# Altium footprint library CONN_B2B.PcbLib: 27 footprints (part 2 of 3) (continued)
## QRF8_018_D_DP_A [mm] "Samtec, QRF8-018-D-DP-A, 0.80 mm Q Rate® High-Speed Ground Plane Slim Body Socket Strip, Differential Pair"
pads (42):
  oval 0.5x1.6 smd mask+0.05: 1(-10,-1.5) 2(-10,1.5) 3(-9.2,-1.5) 4(-9.2,1.5) 5(-7.6,-1.5) 6(-7.6,1.5) 7(-6.8,-1.5) 8(-6.8,1.5) 9(-5.2,-1.5) 10(-5.2,1.5) 11(-4.4,-1.5) 12(-4.4,1.5) 13(-2.8,-1.5) 14(-2.8,1.5) 15(-2,-1.5) 16(-2,1.5) 17(-0.4,-1.5) 18(-0.4,1.5) 19(0.4,-1.5) 20(0.4,1.5) 21(2,-1.5) 22(2,1.5) 23(2.8,-1.5) 24(2.8,1.5) 25(4.4,-1.5) 26(4.4,1.5) 27(5.2,-1.5) 28(5.2,1.5) 29(6.8,-1.5) 30(6.8,1.5) 31(7.6,-1.5) 32(7.6,1.5) 33(9.2,-1.5) 34(9.2,1.5) 35(10,-1.5) 36(10,1.5)
  oval 4.6x0.6 smd mask+0.05: G1(-8.4,0) G2(-2.8,0) G3(2.8,0) G4(8.4,0)
  round 1.2 hole 1.2 unplated mask+0.1: ""(-11.4,-1.2) ""(11.4,-1.2)
Top Overlay:
  lines w0.2: -14.3,-0.8 -14.3,2.4 14.3,2.4 14.3,0.9 14.1,0.9 14.1,-0.9 14.3,-0.9 14.3,-2.4 -12.7,-2.4 -14.3,-0.8
Mechanical 13:
  lines w0.1: -14.185,-0.8 -14.185,2.3 14.185,2.3 14.185,1 14.085,1 14.085,-1 14.185,-1 14.185,-2.3 -12.685,-2.3 -14.185,-0.8
3D body "QRF8-018-05.0-L-D-DP-A.stp": height 6.26, standoff -1.28, extent -14.185,-2.3 14.185,2.3

## QRF8_026_L_D_A [mm] "CONN, B2B, SAMTEC, QRF8, QRF8-026-05.0-L-D-A, 0.80 mm Q Rate® Slim Body Ground Plane Socket"
pads (58):
  oval 0.5x1.8 smd mask+0.05: 1(-10,-1.6) 2(-10,1.6) 3(-9.2,-1.6) 4(-9.2,1.6) 5(-8.4,-1.6) 6(-8.4,1.6) 7(-7.6,-1.6) 8(-7.6,1.6) 9(-6.8,-1.6) 10(-6.8,1.6) 11(-6,-1.6) 12(-6,1.6) 13(-5.2,-1.6) 14(-5.2,1.6) 15(-4.4,-1.6) 16(-4.4,1.6) 17(-3.6,-1.6) 18(-3.6,1.6) 19(-2.8,-1.6) 20(-2.8,1.6) 21(-2,-1.6) 22(-2,1.6) 23(-1.2,-1.6) 24(-1.2,1.6) 25(-0.4,-1.6) 26(-0.4,1.6) 27(0.4,-1.6) 28(0.4,1.6) 29(1.2,-1.6) 30(1.2,1.6) 31(2,-1.6) 32(2,1.6) 33(2.8,-1.6) 34(2.8,1.6) 35(3.6,-1.6) 36(3.6,1.6) 37(4.4,-1.6) 38(4.4,1.6) 39(5.2,-1.6) 40(5.2,1.6) 41(6,-1.6) 42(6,1.6) 43(6.8,-1.6) 44(6.8,1.6) 45(7.6,-1.6) 46(7.6,1.6) 47(8.4,-1.6) 48(8.4,1.6) 49(9.2,-1.6) 50(9.2,1.6) 51(10,-1.6) 52(10,1.6)
  rect 4.8x0.6 smd mask+0.05: G1(-8.4,0) G2(-2.8,0) G3(2.8,0) G4(8.4,0)
  round 0 hole 1.2 unplated: ""(-11.4,-1.2) ""(11.4,-1.2)
Top Overlay:
  lines w0.2: -10.4,-2.4 -12.7,-2.4 -14.3,-0.8 -14.3,2.4 -10.4,2.4 ; 10.4,-2.4 14.3,-2.4 14.3,2.4 10.4,2.4
Mechanical 1:
  lines w0.1: -14.185,-0.8 -12.685,-2.3 14.185,-2.3 14.185,2.3 -14.185,2.3 -14.185,-0.8
3D body "QRF8-026-05.0-L-D-A.stp": height 6.26, standoff -1.28, extent -14.185,-2.3 14.185,2.3

## QRF8_036_D_DP_A [mm] "Samtec, QRF8-036-D-DP-A, 0.80 mm Q Rate® High-Speed Ground Plane Slim Body Socket Strip, Differential Pair"
pads (82):
  oval 0.5x1.6 smd mask+0.05: 1(-22.4,-1.5) 2(-22.4,1.5) 3(-21.6,-1.5) 4(-21.6,1.5) 5(-20,-1.5) 6(-20,1.5) 7(-19.2,-1.5) 8(-19.2,1.5) 9(-17.6,-1.5) 10(-17.6,1.5) 11(-16.8,-1.5) 12(-16.8,1.5) 13(-15.2,-1.5) 14(-15.2,1.5) 15(-14.4,-1.5) 16(-14.4,1.5) 17(-12.8,-1.5) 18(-12.8,1.5) 19(-12,-1.5) 20(-12,1.5) 21(-10.4,-1.5) 22(-10.4,1.5) 23(-9.6,-1.5) 24(-9.6,1.5) 25(-8,-1.5) 26(-8,1.5) 27(-7.2,-1.5) 28(-7.2,1.5) 29(-5.6,-1.5) 30(-5.6,1.5) 31(-4.8,-1.5) 32(-4.8,1.5) 33(-3.2,-1.5) 34(-3.2,1.5) 35(-2.4,-1.5) 36(-2.4,1.5) 37(2.4,-1.5) 38(2.4,1.5) 39(3.2,-1.5) 40(3.2,1.5) 41(4.8,-1.5) 42(4.8,1.5) 43(5.6,-1.5) 44(5.6,1.5) 45(7.2,-1.5) 46(7.2,1.5) 47(8,-1.5) 48(8,1.5) 49(9.6,-1.5) 50(9.6,1.5) 51(10.4,-1.5) 52(10.4,1.5) 53(12,-1.5) 54(12,1.5) 55(12.8,-1.5) 56(12.8,1.5) 57(14.4,-1.5) 58(14.4,1.5) 59(15.2,-1.5) 60(15.2,1.5) 61(16.8,-1.5) 62(16.8,1.5) 63(17.6,-1.5) 64(17.6,1.5) 65(19.2,-1.5) 66(19.2,1.5) 67(20,-1.5) 68(20,1.5) 69(21.6,-1.5) 70(21.6,1.5) 71(22.4,-1.5) 72(22.4,1.5)
  oval 4.6x0.6 smd mask+0.05: G1(-20.8,0) G2(-15.2,0) G3(-9.6,0) G4(-4,0) G5(4,0) G6(9.6,0) G7(15.2,0) G8(20.8,0)
  round 1.2 hole 1.2 unplated mask+0.1: ""(-23.8,-1.2) ""(23.8,-1.2)
Top Overlay:
  lines w0.2: -26.7,-0.8 -25.1,-2.4 26.7,-2.4 26.7,-0.9 26.5,-0.9 26.5,0.9 26.7,0.9 26.7,2.4 -26.7,2.4 -26.7,-0.8
Mechanical 13:
  lines w0.1: -26.585,-0.8 -25.085,-2.3 26.585,-2.3 26.585,-1 26.485,-1 26.485,1 26.585,1 26.585,2.3 -26.585,2.3 -26.585,-0.8
3D body "QRF8-036-05.0-L-D-DP-A.stp": height 6.26, standoff -1.28, extent -26.585,-2.3 26.585,2.3

## QSE_060_01 [mm] "samtec 0.80 mm Q Strip® High Speed Ground Plane Socket Strip"
pads (134):
  oval 0.4x2.4 smd: 1(-27.6,-3) 2(-27.6,3) 3(-26.8,-3) 4(-26.8,3) 5(-26,-3) 6(-26,3) 7(-25.2,-3) 8(-25.2,3) 9(-24.4,-3) 10(-24.4,3) 11(-23.6,-3) 12(-23.6,3) 13(-22.8,-3) 14(-22.8,3) 15(-22,-3) 16(-22,3) 17(-21.2,-3) 18(-21.2,3) 19(-20.4,-3) 20(-20.4,3) 21(-19.6,-3) 22(-19.6,3) 23(-18.8,-3) 24(-18.8,3) 25(-18,-3) 26(-18,3) 27(-17.2,-3) 28(-17.2,3) 29(-16.4,-3) 30(-16.4,3) 31(-15.6,-3) 32(-15.6,3) 33(-14.8,-3) 34(-14.8,3) 35(-14,-3) 36(-14,3) 37(-13.2,-3) 38(-13.2,3) 39(-12.4,-3) 40(-12.4,3) 41(-7.6,-3) 42(-7.6,3) 43(-6.8,-3) 44(-6.8,3) 45(-6,-3) 46(-6,3) 47(-5.2,-3) 48(-5.2,3) 49(-4.4,-3) 50(-4.4,3) 51(-3.6,-3) 52(-3.6,3) 53(-2.8,-3) 54(-2.8,3) 55(-2,-3) 56(-2,3) 57(-1.2,-3) 58(-1.2,3) 59(-0.4,-3) 60(-0.4,3) 61(0.4,-3) 62(0.4,3) 63(1.2,-3) 64(1.2,3) 65(2,-3) 66(2,3) 67(2.8,-3) 68(2.8,3) 69(3.6,-3) 70(3.6,3) 71(4.4,-3) 72(4.4,3) 73(5.2,-3) 74(5.2,3) 75(6,-3) 76(6,3) 77(6.8,-3) 78(6.8,3) 79(7.6,-3) 80(7.6,3) 81(12.4,-3) 82(12.4,3) 83(13.2,-3) 84(13.2,3) 85(14,-3) 86(14,3) 87(14.8,-3) 88(14.8,3) 89(15.6,-3) 90(15.6,3) 91(16.4,-3) 92(16.4,3) 93(17.2,-3) 94(17.2,3) 95(18,-3) 96(18,3) 97(18.8,-3) 98(18.8,3) 99(19.6,-3) 100(19.6,3) 101(20.4,-3) 102(20.4,3) 103(21.2,-3) 104(21.2,3) 105(22,-3) 106(22,3) 107(22.8,-3) 108(22.8,3) 109(23.6,-3) 110(23.6,3) 111(24.4,-3) 112(24.4,3) 113(25.2,-3) 114(25.2,3) 115(26,-3) 116(26,3) 117(26.8,-3) 118(26.8,3) 119(27.6,-3) 120(27.6,3)
  oval 3x1 smd mask+0.1: 121(-28.1,0) 124(-12,0) 125(-8.2,0) 128(8.2,0) 129(12,0) 132(28.1,0)
  oval 5x1 smd mask+0.1: 122(-23.2,0) 123(-16.9,0) 126(-3.3,0) 127(3.3,0) 130(16.9,0) 131(23.2,0)
  round 1 hole 1 unplated: ""(-30,2.7) ""(30.1,2.7)
Top Overlay:
  circle w0.2: c-28.3,-4.1 r0.2
  lines w0.2: -30.7,1.3 -28.3,3.7 ; -28,-3.7 -30.7,-3.7 -30.7,3.7 -28,3.7 ; -11.95,-3.7 -8.05,-3.7 ; -11.95,3.7 -8.05,3.7 ; 8.05,-3.7 11.95,-3.7 ; 8.05,3.7 11.95,3.7 ; 27.95,-3.7 30.7,-3.7 30.7,3.7 28,3.7 ; 28.3,3.7 30.7,1.3
Mechanical 13:
  lines w0.1: -30.6,-3.6 -30.6,3.6 30.6,3.6 30.6,-3.6 -30.6,-3.6
3D body "Samtec-QSE-060-01-L-D-A.step": height 3.25, standoff -0.75, extent -30.6,-3.7 30.677,3.793

## QSH_030_01 [mm] "samtec 0.50mm Q Strip® High Speed Ground Plane Socket Strip"
height 1.2
pads (66):
  oval 0.3x2.4 smd paste-0.05 mask+0.05: 1(-7.25,-3) 2(-7.25,3) 3(-6.75,-3) 4(-6.75,3) 5(-6.25,-3) 6(-6.25,3) 7(-5.75,-3) 8(-5.75,3) 9(-5.25,-3) 10(-5.25,3) 11(-4.75,-3) 12(-4.75,3) 13(-4.25,-3) 14(-4.25,3) 15(-3.75,-3) 16(-3.75,3) 17(-3.25,-3) 18(-3.25,3) 19(-2.75,-3) 20(-2.75,3) 21(-2.25,-3) 22(-2.25,3) 23(-1.75,-3) 24(-1.75,3) 25(-1.25,-3) 26(-1.25,3) 27(-0.75,-3) 28(-0.75,3) 29(-0.25,-3) 30(-0.25,3) 31(0.25,-3) 32(0.25,3) 33(0.75,-3) 34(0.75,3) 35(1.25,-3) 36(1.25,3) 37(1.75,-3) 38(1.75,3) 39(2.25,-3) 40(2.25,3) 41(2.75,-3) 42(2.75,3) 43(3.25,-3) 44(3.25,3) 45(3.75,-3) 46(3.75,3) 47(4.25,-3) 48(4.25,3) 49(4.75,-3) 50(4.75,3) 51(5.25,-3) 52(5.25,3) 53(5.75,-3) 54(5.75,3) 55(6.25,-3) 56(6.25,3) 57(6.75,-3) 58(6.75,3) 59(7.25,-3) 60(7.25,3)
  rect 2.5x0.5 smd mask+0.1: 61(-8.065,0) 64(8.065,0)
  rect 5x0.5 smd mask+0.1: 62(-3.175,0) 63(3.175,0)
  round 1 hole 1 unplated: ""(-10,2.7) ""(10,2.7)
Top Overlay:
  circle w0.2: c-8.15,-4.05 r0.2
  lines w0.2: -10.8,0 -10.8,0.63 -7.747,3.683 -10.5,3.683 ; -10.8,3.6 -10.8,-3.683 -7.747,-3.683 ; 7.747,-3.683 10.8,-3.683 10.8,3.6 ; 10.541,3.683 7.747,3.683 10.8,0.63 10.8,0
  text "1" at -7.7,-4.5 h0.6
  text "2" at -8,4 h0.6
Mechanical 15:
  lines w0.254: -10.655,-3.62 -10.655,3.62 10.655,3.62 10.655,-3.62 -10.655,-3.62
3D body "QSH-030-01-L-D-A.stp": height 3.25, standoff -0.31, extent -10.65,-3.75 10.661,3.744

## QSH_060_01 [mm] "samtec 0.50mm Q Strip® High Speed Ground Plane Socket Strip, QSH-060-01-L-D-A"
pads (130):
  oval 0.25x2.5 smd mask+0.05: 1(-17.25,-3) 3(-16.75,-3) 5(-16.25,-3) 7(-15.75,-3) 9(-15.25,-3) 11(-14.75,-3) 13(-14.25,-3) 15(-13.75,-3) 17(-13.25,-3) 19(-12.75,-3) 21(-12.25,-3) 23(-11.75,-3) 25(-11.25,-3) 27(-10.75,-3) 29(-10.25,-3) 31(-9.75,-3) 33(-9.25,-3) 35(-8.75,-3) 37(-8.25,-3) 39(-7.75,-3) 41(-7.25,-3) 43(-6.75,-3) 45(-6.25,-3) 47(-5.75,-3) 49(-5.25,-3) 51(-4.75,-3) 53(-4.25,-3) 55(-3.75,-3) 57(-3.25,-3) 59(-2.75,-3) 61(2.75,-3) 63(3.25,-3) 65(3.75,-3) 67(4.25,-3) 69(4.75,-3) 71(5.25,-3) 73(5.75,-3) 75(6.25,-3) 77(6.75,-3) 79(7.25,-3) 81(7.75,-3) 83(8.25,-3) 85(8.75,-3) 87(9.25,-3) 89(9.75,-3) 91(10.25,-3) 93(10.75,-3) 95(11.25,-3) 97(11.75,-3) 99(12.25,-3) 101(12.75,-3) 103(13.25,-3) 105(13.75,-3) 107(14.25,-3) 109(14.75,-3) 111(15.25,-3) 113(15.75,-3) 115(16.25,-3) 117(16.75,-3) 119(17.25,-3)
  oval 0.25x2.4 smd mask+0.05: 2(-17.25,3) 4(-16.75,3) 6(-16.25,3) 8(-15.75,3) 10(-15.25,3) 12(-14.75,3) 14(-14.25,3) 16(-13.75,3) 18(-13.25,3) 20(-12.75,3) 22(-12.25,3) 24(-11.75,3) 26(-11.25,3) 28(-10.75,3) 30(-10.25,3) 32(-9.75,3) 34(-9.25,3) 36(-8.75,3) 38(-8.25,3) 40(-7.75,3) 42(-7.25,3) 44(-6.75,3) 46(-6.25,3) 48(-5.75,3) 50(-5.25,3) 52(-4.75,3) 54(-4.25,3) 56(-3.75,3) 58(-3.25,3) 60(-2.75,3) 62(2.75,3) 64(3.25,3) 66(3.75,3) 68(4.25,3) 70(4.75,3) 72(5.25,3) 74(5.75,3) 76(6.25,3) 78(6.75,3) 80(7.25,3) 82(7.75,3) 84(8.25,3) 86(8.75,3) 88(9.25,3) 90(9.75,3) 92(10.25,3) 94(10.75,3) 96(11.25,3) 98(11.75,3) 100(12.25,3) 102(12.75,3) 104(13.25,3) 106(13.75,3) 108(14.25,3) 110(14.75,3) 112(15.25,3) 114(15.75,3) 116(16.25,3) 118(16.75,3) 120(17.25,3)
  oval 2.5x0.5 smd mask+0.1: 121(-18.065,0) 124(-1.935,0) 125(1.935,0) 128(18.065,0)
  oval 5x0.5 smd mask+0.1: 122(-13.175,0) 123(-6.825,0) 126(6.825,0) 127(13.175,0)
  round 1 hole 1 unplated: ""(-20,2.7) ""(20,2.7)
Top Overlay:
  circle w0.2: c-18.3,-4.3 r0.2
  lines w0.2: -17.5,-3.9 -20.8,-3.9 -20.8,3.9 -17.5,3.9 ; -2.4,-3.9 2.4,-3.9 ; -2.4,3.9 2.4,3.9 ; 17.5,-3.9 20.8,-3.9 20.8,3.9 17.5,3.9
  text "1" at -17.8,-4.9 h0.6
  text "2" at -18,4.2 h0.6
  text "60" at -2.3,4.2 h0.6
  text "59" at -2.3,-4.8 h0.6
  text "62" at 1.4,4.2 h0.6
  text "61" at 1.7,-4.8 h0.6
  text "119" at 17.6,-4.8 h0.6
  text "120" at 17.5,4.3 h0.6
Mechanical 15:
  lines w0.254: -20.65,-3.62 -20.65,3.62 20.65,3.62 20.65,-3.62 -20.65,-3.62
3D body "Samtec-QSH-060-01-L-D-A.step": height 3.2, standoff -0.8, extent -20.677,-3.746 20.636,3.747

## QTE_060_03 [mm] "samtec 0.80 mm Q Strip® High Speed Ground Plane Terminal Strip"
pads (134):
  oval 0.4x2.4 smd: 1(-27.6,3) 2(-27.6,-3) 3(-26.8,3) 4(-26.8,-3) 5(-26,3) 6(-26,-3) 7(-25.2,3) 8(-25.2,-3) 9(-24.4,3) 10(-24.4,-3) 11(-23.6,3) 12(-23.6,-3) 13(-22.8,3) 14(-22.8,-3) 15(-22,3) 16(-22,-3) 17(-21.2,3) 18(-21.2,-3) 19(-20.4,3) 20(-20.4,-3) 21(-19.6,3) 22(-19.6,-3) 23(-18.8,3) 24(-18.8,-3) 25(-18,3) 26(-18,-3) 27(-17.2,3) 28(-17.2,-3) 29(-16.4,3) 30(-16.4,-3) 31(-15.6,3) 32(-15.6,-3) 33(-14.8,3) 34(-14.8,-3) 35(-14,3) 36(-14,-3) 37(-13.2,3) 38(-13.2,-3) 39(-12.4,3) 40(-12.4,-3) 41(-7.6,3) 42(-7.6,-3) 43(-6.8,3) 44(-6.8,-3) 45(-6,3) 46(-6,-3) 47(-5.2,3) 48(-5.2,-3) 49(-4.4,3) 50(-4.4,-3) 51(-3.6,3) 52(-3.6,-3) 53(-2.8,3) 54(-2.8,-3) 55(-2,3) 56(-2,-3) 57(-1.2,3) 58(-1.2,-3) 59(-0.4,3) 60(-0.4,-3) 61(0.4,3) 62(0.4,-3) 63(1.2,3) 64(1.2,-3) 65(2,3) 66(2,-3) 67(2.8,3) 68(2.8,-3) 69(3.6,3) 70(3.6,-3) 71(4.4,3) 72(4.4,-3) 73(5.2,3) 74(5.2,-3) 75(6,3) 76(6,-3) 77(6.8,3) 78(6.8,-3) 79(7.6,3) 80(7.6,-3) 81(12.4,3) 82(12.4,-3) 83(13.2,3) 84(13.2,-3) 85(14,3) 86(14,-3) 87(14.8,3) 88(14.8,-3) 89(15.6,3) 90(15.6,-3) 91(16.4,3) 92(16.4,-3) 93(17.2,3) 94(17.2,-3) 95(18,3) 96(18,-3) 97(18.8,3) 98(18.8,-3) 99(19.6,3) 100(19.6,-3) 101(20.4,3) 102(20.4,-3) 103(21.2,3) 104(21.2,-3) 105(22,3) 106(22,-3) 107(22.8,3) 108(22.8,-3) 109(23.6,3) 110(23.6,-3) 111(24.4,3) 112(24.4,-3) 113(25.2,3) 114(25.2,-3) 115(26,3) 116(26,-3) 117(26.8,3) 118(26.8,-3) 119(27.6,3) 120(27.6,-3)
  oval 3x1 smd mask+0.1: 121(-28.1,0) 124(-12,0) 125(-8.2,0) 128(8.2,0) 129(12,0) 132(28.1,0)
  oval 5x1 smd mask+0.1: 122(-23.2,0) 123(-16.9,0) 126(-3.3,0) 127(3.3,0) 130(16.9,0) 131(23.2,0)
  round 1 hole 1 unplated: ""(-29.2,2.1) ""(29.2,2.1)
Top Overlay:
  circle w0.2: c-28.3,3.7 r0.2
  lines w0.2: -28,-3.1 -28.4,-3.1 -30.1,-1.4 -30.1,3.1 -28,3.1 ; -11.95,-3.1 -8.05,-3.1 ; -11.95,3.1 -8.05,3.1 ; 8.05,-3.1 11.95,-3.1 ; 8.05,3.1 11.95,3.1 ; 28,-3.1 28.4,-3.1 30.1,-1.4 30.1,3.1 28,3.1
Mechanical 13:
  lines w0.1: -30,-1.1 -28.1,-3 28.1,-3 30,-1.1 30,3 -30,3 -30,-1.1
3D body "Samtec-QTE-060-03-L-D-A.step": height 10.26, standoff -0.71, extent -30,-3.456 30.008,3.656

## QTH_030_01 [mm] "samtec 0.50 mm Q Strip® High Speed Ground Plane Terminal Strip"
pads (66):
  oval 0.25x1.6 smd mask+0.05: 1(-7.25,3.2) 2(-7.25,-3.2) 3(-6.75,3.2) 4(-6.75,-3.2) 5(-6.25,3.2) 6(-6.25,-3.2) 7(-5.75,3.2) 8(-5.75,-3.2) 9(-5.25,3.2) 10(-5.25,-3.2) 11(-4.75,3.2) 12(-4.75,-3.2) 13(-4.25,3.2) 14(-4.25,-3.2) 15(-3.75,3.2) 16(-3.75,-3.2) 17(-3.25,3.2) 18(-3.25,-3.2) 19(-2.75,3.2) 20(-2.75,-3.2) 21(-2.25,3.2) 22(-2.25,-3.2) 23(-1.75,3.2) 24(-1.75,-3.2) 25(-1.25,3.2) 26(-1.25,-3.2) 27(-0.75,3.2) 28(-0.75,-3.2) 29(-0.25,3.2) 30(-0.25,-3.2) 31(0.25,3.2) 32(0.25,-3.2) 33(0.75,3.2) 34(0.75,-3.2) 35(1.25,3.2) 36(1.25,-3.2) 37(1.75,3.2) 38(1.75,-3.2) 39(2.25,3.2) 40(2.25,-3.2) 41(2.75,3.2) 42(2.75,-3.2) 43(3.25,3.2) 44(3.25,-3.2) 45(3.75,3.2) 46(3.75,-3.2) 47(4.25,3.2) 48(4.25,-3.2) 49(4.75,3.2) 50(4.75,-3.2) 51(5.25,3.2) 52(5.25,-3.2) 53(5.75,3.2) 54(5.75,-3.2) 55(6.25,3.2) 56(6.25,-3.2) 57(6.75,3.2) 58(6.75,-3.2) 59(7.25,3.2) 60(7.25,-3.2)
  oval 2.5x0.7 smd mask+0.1: 61(-8.445,0) 64(8.445,0)
  oval 5x0.7 smd mask+0.1: 62(-3.175,0) 63(3.175,0)
  round 1 hole 1 unplated: ""(-9.25,2) ""(9.25,2)
Top Overlay:
  circle w0.2: c-8.3,3.7 r0.2
  lines w0.2: -7.6,-3.2 -8.4,-3.2 -10.2,-1.4 -10.2,3.2 -7.6,3.2 ; 7.5,-3.2 8.3,-3.2 10.2,-1.3 10.2,3.2 7.6,3.2
  text "2" at -8,-4.1 h0.6
  text "1" at -7.9,3.5 h0.6
Mechanical 15:
  lines w0.254: -10,-1.285 -10,2.985 10,2.985 10,-1.185 8.2,-2.985 -8.3,-2.985 -10,-1.285
3D body "Samtec-QTH-030-01-L-D-A.step": height 4.31, standoff -0.69, extent -10.001,-3.556 10.001,3.556

## QTH_030_04 [mm] "samtec 0.50 mm Q Strip® High Speed Ground Plane Terminal Strip"
height 1.2
pads (66):
  oval 0.3x1.6 smd paste-0.065 mask+0.05: 1(-7.25,3.1) 2(-7.25,-3.1) 3(-6.75,3.1) 4(-6.75,-3.1) 5(-6.25,3.1) 6(-6.25,-3.1) 7(-5.75,3.1) 8(-5.75,-3.1) 9(-5.25,3.1) 10(-5.25,-3.1) 11(-4.75,3.1) 12(-4.75,-3.1) 13(-4.25,3.1) 14(-4.25,-3.1) 15(-3.75,3.1) 16(-3.75,-3.1) 17(-3.25,3.1) 18(-3.25,-3.1) 19(-2.75,3.1) 20(-2.75,-3.1) 21(-2.25,3.1) 22(-2.25,-3.1) 23(-1.75,3.1) 24(-1.75,-3.1) 25(-1.25,3.1) 26(-1.25,-3.1) 27(-0.75,3.1) 28(-0.75,-3.1) 29(-0.25,3.1) 30(-0.25,-3.1) 31(0.25,3.1) 32(0.25,-3.1) 33(0.75,3.1) 34(0.75,-3.1) 35(1.25,3.1) 36(1.25,-3.1) 37(1.75,3.1) 38(1.75,-3.1) 39(2.25,3.1) 40(2.25,-3.1) 41(2.75,3.1) 42(2.75,-3.1) 43(3.25,3.1) 44(3.25,-3.1) 45(3.75,3.1) 46(3.75,-3.1) 47(4.25,3.1) 48(4.25,-3.1) 49(4.75,3.1) 50(4.75,-3.1) 51(5.25,3.1) 52(5.25,-3.1) 53(5.75,3.1) 54(5.75,-3.1) 55(6.25,3.1) 56(6.25,-3.1) 57(6.75,3.1) 58(6.75,-3.1) 59(7.25,3.1) 60(7.25,-3.1)
  rect 2.5x0.7 smd mask+0.1: 61(-8.45,0) 64(8.45,0)
  rect 5x0.7 smd mask+0.1: 62(-3.175,0) 63(3.175,0)
  round 1 hole 1 unplated: ""(-9.24,2.03) ""(9.24,2.03)
Top Overlay:
  lines w0.2: -7.6,-3.7 -10.1,-3.7 -10.1,3.7 -7.6,3.7 ; 7.6,-3.7 10.1,-3.7 10.1,3.7 7.6,3.7
  text "2" at -7.9,-4.6 h0.6
  text "1" at -7.8,4 h0.6
3D body "QTH-030-04-L-D-A.stp": height 15.24, standoff -0.77, extent -10,-3.562 10.015,3.55

## QTH_060_01 [mm] "samtec 0.50 mm Q Strip® High Speed Ground Plane Terminal Strip"
pads (130):
  oval 0.25x1.6 smd mask+0.05: 1(-17.25,3.2) 2(-17.25,-3.2) 3(-16.75,3.2) 4(-16.75,-3.2) 5(-16.25,3.2) 6(-16.25,-3.2) 7(-15.75,3.2) 8(-15.75,-3.2) 9(-15.25,3.2) 10(-15.25,-3.2) 11(-14.75,3.2) 12(-14.75,-3.2) 13(-14.25,3.2) 14(-14.25,-3.2) 15(-13.75,3.2) 16(-13.75,-3.2) 17(-13.25,3.2) 18(-13.25,-3.2) 19(-12.75,3.2) 20(-12.75,-3.2) 21(-12.25,3.2) 22(-12.25,-3.2) 23(-11.75,3.2) 24(-11.75,-3.2) 25(-11.25,3.2) 26(-11.25,-3.2) 27(-10.75,3.2) 28(-10.75,-3.2) 29(-10.25,3.2) 30(-10.25,-3.2) 31(-9.75,3.2) 32(-9.75,-3.2) 33(-9.25,3.2) 34(-9.25,-3.2) 35(-8.75,3.2) 36(-8.75,-3.2) 37(-8.25,3.2) 38(-8.25,-3.2) 39(-7.75,3.2) 40(-7.75,-3.2) 41(-7.25,3.2) 42(-7.25,-3.2) 43(-6.75,3.2) 44(-6.75,-3.2) 45(-6.25,3.2) 46(-6.25,-3.2) 47(-5.75,3.2) 48(-5.75,-3.2) 49(-5.25,3.2) 50(-5.25,-3.2) 51(-4.75,3.2) 52(-4.75,-3.2) 53(-4.25,3.2) 54(-4.25,-3.2) 55(-3.75,3.2) 56(-3.75,-3.2) 57(-3.25,3.2) 58(-3.25,-3.2) 59(-2.75,3.2) 60(-2.75,-3.2) 61(2.75,3.2) 62(2.75,-3.2) 63(3.25,3.2) 64(3.25,-3.2) 65(3.75,3.2) 66(3.75,-3.2) 67(4.25,3.2) 68(4.25,-3.2) 69(4.75,3.2) 70(4.75,-3.2) 71(5.25,3.2) 72(5.25,-3.2) 73(5.75,3.2) 74(5.75,-3.2) 75(6.25,3.2) 76(6.25,-3.2) 77(6.75,3.2) 78(6.75,-3.2) 79(7.25,3.2) 80(7.25,-3.2) 81(7.75,3.2) 82(7.75,-3.2) 83(8.25,3.2) 84(8.25,-3.2) 85(8.75,3.2) 86(8.75,-3.2) 87(9.25,3.2) 88(9.25,-3.2) 89(9.75,3.2) 90(9.75,-3.2) 91(10.25,3.2) 92(10.25,-3.2) 93(10.75,3.2) 94(10.75,-3.2) 95(11.25,3.2) 96(11.25,-3.2) 97(11.75,3.2) 98(11.75,-3.2) 99(12.25,3.2) 100(12.25,-3.2) 101(12.75,3.2) 102(12.75,-3.2) 103(13.25,3.2) 104(13.25,-3.2) 105(13.75,3.2) 106(13.75,-3.2) 107(14.25,3.2) 108(14.25,-3.2) 109(14.75,3.2) 110(14.75,-3.2) 111(15.25,3.2) 112(15.25,-3.2) 113(15.75,3.2) 114(15.75,-3.2) 115(16.25,3.2) 116(16.25,-3.2) 117(16.75,3.2) 118(16.75,-3.2) 119(17.25,3.2) 120(17.25,-3.2)
  oval 2.5x0.7 smd mask+0.1: 121(-18.445,0) 124(-1.555,0) 125(1.555,0) 128(18.445,0)
  oval 5x0.7 smd mask+0.1: 122(-13.175,0) 123(-6.825,0) 126(6.825,0) 127(13.175,0)
  round 1 hole 1 unplated: ""(-19.25,2) ""(19.25,2)
Top Overlay:
  circle w0.2: c-18.2,3.7 r0.2
  lines w0.2: -17.6,-3.2 -18.6,-3.2 -20.2,-1.6 -20.2,3.2 -17.6,3.2 ; -2.4,-3.2 2.4,-3.2 ; -2.4,3.2 2.4,3.2 ; 17.6,-3.2 18.6,-3.2 20.2,-1.6 20.2,3.2 17.6,3.2
  text "1" at -17.8,3.5 h0.6
  text "2" at -17.98,-4.057 h0.6
Mechanical 15:
  lines w0.254: -20.005,-1.461 -18.481,-2.985 18.481,-2.985 20.005,-1.461 20.005,2.985 -20.005,2.985 -20.005,-1.461
3D body "Samtec-QTH-060-01-L-D-A.step": height 4.31, standoff -0.69, extent -20.003,-3.556 20.002,3.556

## SEAF8_20_S_10 [mm] "CONN, B2B, SAMTEC, SEAF8-20-05.0-S-10-2-K"
pads (402):
  round 0.5 smd paste+0.064 mask+0.05: A1(-7.6,4.6) A2(-6.8,4.6) A3(-6,4.6) A4(-5.2,4.6) A5(-4.4,4.6) A6(-3.6,4.6) A7(-2.8,4.6) A8(-2,4.6) A9(-1.2,4.6) A10(-0.4,4.6) A11(0.4,4.6) A12(1.2,4.6) A13(2,4.6) A14(2.8,4.6) A15(3.6,4.6) A16(4.4,4.6) A17(5.2,4.6) A18(6,4.6) A19(6.8,4.6) A20(7.6,4.6) B1(-7.6,3.4) B2(-6.8,3.4) B3(-6,3.4) B4(-5.2,3.4) B5(-4.4,3.4) B6(-3.6,3.4) B7(-2.8,3.4) B8(-2,3.4) B9(-1.2,3.4) B10(-0.4,3.4) B11(0.4,3.4) B12(1.2,3.4) B13(2,3.4) B14(2.8,3.4) B15(3.6,3.4) B16(4.4,3.4) B17(5.2,3.4) B18(6,3.4) B19(6.8,3.4) B20(7.6,3.4) C1(-7.6,2.6) C2(-6.8,2.6) C3(-6,2.6) C4(-5.2,2.6) C5(-4.4,2.6) C6(-3.6,2.6) C7(-2.8,2.6) C8(-2,2.6) C9(-1.2,2.6) C10(-0.4,2.6) C11(0.4,2.6) C12(1.2,2.6) C13(2,2.6) C14(2.8,2.6) C15(3.6,2.6) C16(4.4,2.6) C17(5.2,2.6) C18(6,2.6) C19(6.8,2.6) C20(7.6,2.6) D1(-7.6,1.4) D2(-6.8,1.4) D3(-6,1.4) D4(-5.2,1.4) D5(-4.4,1.4) D6(-3.6,1.4) D7(-2.8,1.4) D8(-2,1.4) D9(-1.2,1.4) D10(-0.4,1.4) D11(0.4,1.4) D12(1.2,1.4) D13(2,1.4) D14(2.8,1.4) D15(3.6,1.4) D16(4.4,1.4) D17(5.2,1.4) D18(6,1.4) D19(6.8,1.4) D20(7.6,1.4) E1(-7.6,0.6) E2(-6.8,0.6) E3(-6,0.6) E4(-5.2,0.6) E5(-4.4,0.6) E6(-3.6,0.6) E7(-2.8,0.6) E8(-2,0.6) E9(-1.2,0.6) E10(-0.4,0.6) E11(0.4,0.6) E12(1.2,0.6) E13(2,0.6) E14(2.8,0.6) E15(3.6,0.6) E16(4.4,0.6) E17(5.2,0.6) E18(6,0.6) E19(6.8,0.6) E20(7.6,0.6) F1(-7.6,-0.6) F2(-6.8,-0.6) F3(-6,-0.6) F4(-5.2,-0.6) F5(-4.4,-0.6) F6(-3.6,-0.6) F7(-2.8,-0.6) F8(-2,-0.6) F9(-1.2,-0.6) F10(-0.4,-0.6) F11(0.4,-0.6) F12(1.2,-0.6) F13(2,-0.6) F14(2.8,-0.6) F15(3.6,-0.6) F16(4.4,-0.6) F17(5.2,-0.6) F18(6,-0.6) F19(6.8,-0.6) F20(7.6,-0.6) G1(-7.6,-1.4) G2(-6.8,-1.4) G3(-6,-1.4) G4(-5.2,-1.4) G5(-4.4,-1.4) G6(-3.6,-1.4) G7(-2.8,-1.4) G8(-2,-1.4) G9(-1.2,-1.4) G10(-0.4,-1.4) G11(0.4,-1.4) G12(1.2,-1.4) G13(2,-1.4) G14(2.8,-1.4) G15(3.6,-1.4) G16(4.4,-1.4) G17(5.2,-1.4) G18(6,-1.4) G19(6.8,-1.4) G20(7.6,-1.4) H1(-7.6,-2.6) H2(-6.8,-2.6) H3(-6,-2.6) H4(-5.2,-2.6) H5(-4.4,-2.6) H6(-3.6,-2.6) H7(-2.8,-2.6) H8(-2,-2.6) H9(-1.2,-2.6) H10(-0.4,-2.6) H11(0.4,-2.6) H12(1.2,-2.6) H13(2,-2.6) H14(2.8,-2.6) H15(3.6,-2.6) H16(4.4,-2.6) H17(5.2,-2.6) H18(6,-2.6) H19(6.8,-2.6) H20(7.6,-2.6) J1(-7.6,-3.4) J2(-6.8,-3.4) J3(-6,-3.4) J4(-5.2,-3.4) J5(-4.4,-3.4) J6(-3.6,-3.4) J7(-2.8,-3.4) J8(-2,-3.4) J9(-1.2,-3.4) J10(-0.4,-3.4) J11(0.4,-3.4) J12(1.2,-3.4) J13(2,-3.4) J14(2.8,-3.4) J15(3.6,-3.4) J16(4.4,-3.4) J17(5.2,-3.4) J18(6,-3.4) J19(6.8,-3.4) J20(7.6,-3.4) K1(-7.6,-4.6) K2(-6.8,-4.6) K3(-6,-4.6) K4(-5.2,-4.6) K5(-4.4,-4.6) K6(-3.6,-4.6) K7(-2.8,-4.6) K8(-2,-4.6) K9(-1.2,-4.6) K10(-0.4,-4.6) K11(0.4,-4.6) K12(1.2,-4.6) K13(2,-4.6) K14(2.8,-4.6) K15(3.6,-4.6) K16(4.4,-4.6) K17(5.2,-4.6) K18(6,-4.6) K19(6.8,-4.6) K20(7.6,-4.6)
  round 0 hole 1.5 unplated: ""(-9.3,-2.3) ""(9.3,0)
  oval 0.65x0.7 on Top Paste: ""(-7.6,-4.55) ""(-7.6,-3.45) ""(-7.6,-2.55) ""(-7.6,-1.45) ""(-7.6,-0.55) ""(-7.6,0.55) ""(-7.6,1.45) ""(-7.6,2.55) ""(-7.6,3.45) ""(-7.6,4.55) ""(-6.8,-4.55) ""(-6.8,-3.45) ""(-6.8,-2.55) ""(-6.8,-1.45) ""(-6.8,-0.55) ""(-6.8,0.55) ""(-6.8,1.45) ""(-6.8,2.55) ""(-6.8,3.45) ""(-6.8,4.55) ""(-6,-4.55) ""(-6,-3.45) ""(-6,-2.55) ""(-6,-1.45) ""(-6,-0.55) ""(-6,0.55) ""(-6,1.45) ""(-6,2.55) ""(-6,3.45) ""(-6,4.55) ""(-5.2,-4.55) ""(-5.2,-3.45) ""(-5.2,-2.55) ""(-5.2,-1.45) ""(-5.2,-0.55) ""(-5.2,0.55) ""(-5.2,1.45) ""(-5.2,2.55) ""(-5.2,3.45) ""(-5.2,4.55) ""(-4.4,-4.55) ""(-4.4,-3.45) ""(-4.4,-2.55) ""(-4.4,-1.45) ""(-4.4,-0.55) ""(-4.4,0.55) ""(-4.4,1.45) ""(-4.4,2.55) ""(-4.4,3.45) ""(-4.4,4.55) ""(-3.6,-4.55) ""(-3.6,-3.45) ""(-3.6,-2.55) ""(-3.6,-1.45) ""(-3.6,-0.55) ""(-3.6,0.55) ""(-3.6,1.45) ""(-3.6,2.55) ""(-3.6,3.45) ""(-3.6,4.55) ""(-2.8,-4.55) ""(-2.8,-3.45) ""(-2.8,-2.55) ""(-2.8,-1.45) ""(-2.8,-0.55) ""(-2.8,0.55) ""(-2.8,1.45) ""(-2.8,2.55) ""(-2.8,3.45) ""(-2.8,4.55) ""(-2,-4.55) ""(-2,-3.45) ""(-2,-2.55) ""(-2,-1.45) ""(-2,-0.55) ""(-2,0.55) ""(-2,1.45) ""(-2,2.55) ""(-2,3.45) ""(-2,4.55) ""(-1.2,-4.55) ""(-1.2,-3.45) ""(-1.2,-2.55) ""(-1.2,-1.45) ""(-1.2,-0.55) ""(-1.2,0.55) ""(-1.2,1.45) ""(-1.2,2.55) ""(-1.2,3.45) ""(-1.2,4.55) ""(-0.4,-4.55) ""(-0.4,-3.45) ""(-0.4,-2.55) ""(-0.4,-1.45) ""(-0.4,-0.55) ""(-0.4,0.55) ""(-0.4,1.45) ""(-0.4,2.55) ""(-0.4,3.45) ""(-0.4,4.55) ""(0.4,-4.55) ""(0.4,-3.45) ""(0.4,-2.55) ""(0.4,-1.45) ""(0.4,-0.55) ""(0.4,0.55) ""(0.4,1.45) ""(0.4,2.55) ""(0.4,3.45) ""(0.4,4.55) ""(1.2,-4.55) ""(1.2,-3.45) ""(1.2,-2.55) ""(1.2,-1.45) ""(1.2,-0.55) ""(1.2,0.55) ""(1.2,1.45) ""(1.2,2.55) ""(1.2,3.45) ""(1.2,4.55) ""(2,-4.55) ""(2,-3.45) ""(2,-2.55) ""(2,-1.45) ""(2,-0.55) ""(2,0.55) ""(2,1.45) ""(2,2.55) ""(2,3.45) ""(2,4.55) ""(2.8,-4.55) ""(2.8,-3.45) ""(2.8,-2.55) ""(2.8,-1.45) ""(2.8,-0.55) ""(2.8,0.55) ""(2.8,1.45) ""(2.8,2.55) ""(2.8,3.45) ""(2.8,4.55) ""(3.6,-4.55) ""(3.6,-3.45) ""(3.6,-2.55) ""(3.6,-1.45) ""(3.6,-0.55) ""(3.6,0.55) ""(3.6,1.45) ""(3.6,2.55) ""(3.6,3.45) ""(3.6,4.55) ""(4.4,-4.55) ""(4.4,-3.45) ""(4.4,-2.55) ""(4.4,-1.45) ""(4.4,-0.55) ""(4.4,0.55) ""(4.4,1.45) ""(4.4,2.55) ""(4.4,3.45) ""(4.4,4.55) ""(5.2,-4.55) ""(5.2,-3.45) ""(5.2,-2.55) ""(5.2,-1.45) ""(5.2,-0.55) ""(5.2,0.55) ""(5.2,1.45) ""(5.2,2.55) ""(5.2,3.45) ""(5.2,4.55) ""(6,-4.55) ""(6,-3.45) ""(6,-2.55) ""(6,-1.45) ""(6,-0.55) ""(6,0.55) ""(6,1.45) ""(6,2.55) ""(6,3.45) ""(6,4.55) ""(6.8,-4.55) ""(6.8,-3.45) ""(6.8,-2.55) ""(6.8,-1.45) ""(6.8,-0.55) ""(6.8,0.55) ""(6.8,1.45) ""(6.8,2.55) ""(6.8,3.45) ""(6.8,4.55) ""(7.6,-4.55) ""(7.6,-3.45) ""(7.6,-2.55) ""(7.6,-1.45) ""(7.6,-0.55) ""(7.6,0.55) ""(7.6,1.45) ""(7.6,2.55) ""(7.6,3.45) ""(7.6,4.55)
Top Overlay:
  lines w0.2: -11,-6 -9.3,-6 -9.3,-5.3 9.3,-5.3 9.3,-6 11,-6 11,6 9.3,6 9.3,5.3 -9.3,5.3 -9.3,6 -11,6 -11,-6
3D body "SEAF8-20-05.0-S-10-2-K.stp": height 4.65, standoff -1.32, extent -10.92,-5.9 10.92,5.9